# Altium footprint library Capacitors.PcbLib: 90 footprints (part 6 of 6)
Each footprint in its own frame and in the unit in brackets; x right, y up, seen from the top. Pads: shape width x height; smd on the part's side, far side on the other; paste and mask are expansions set on the pad; w line width, h text height; cw(c..) or ccw(c..) is an arc to the next point about the centre after c.
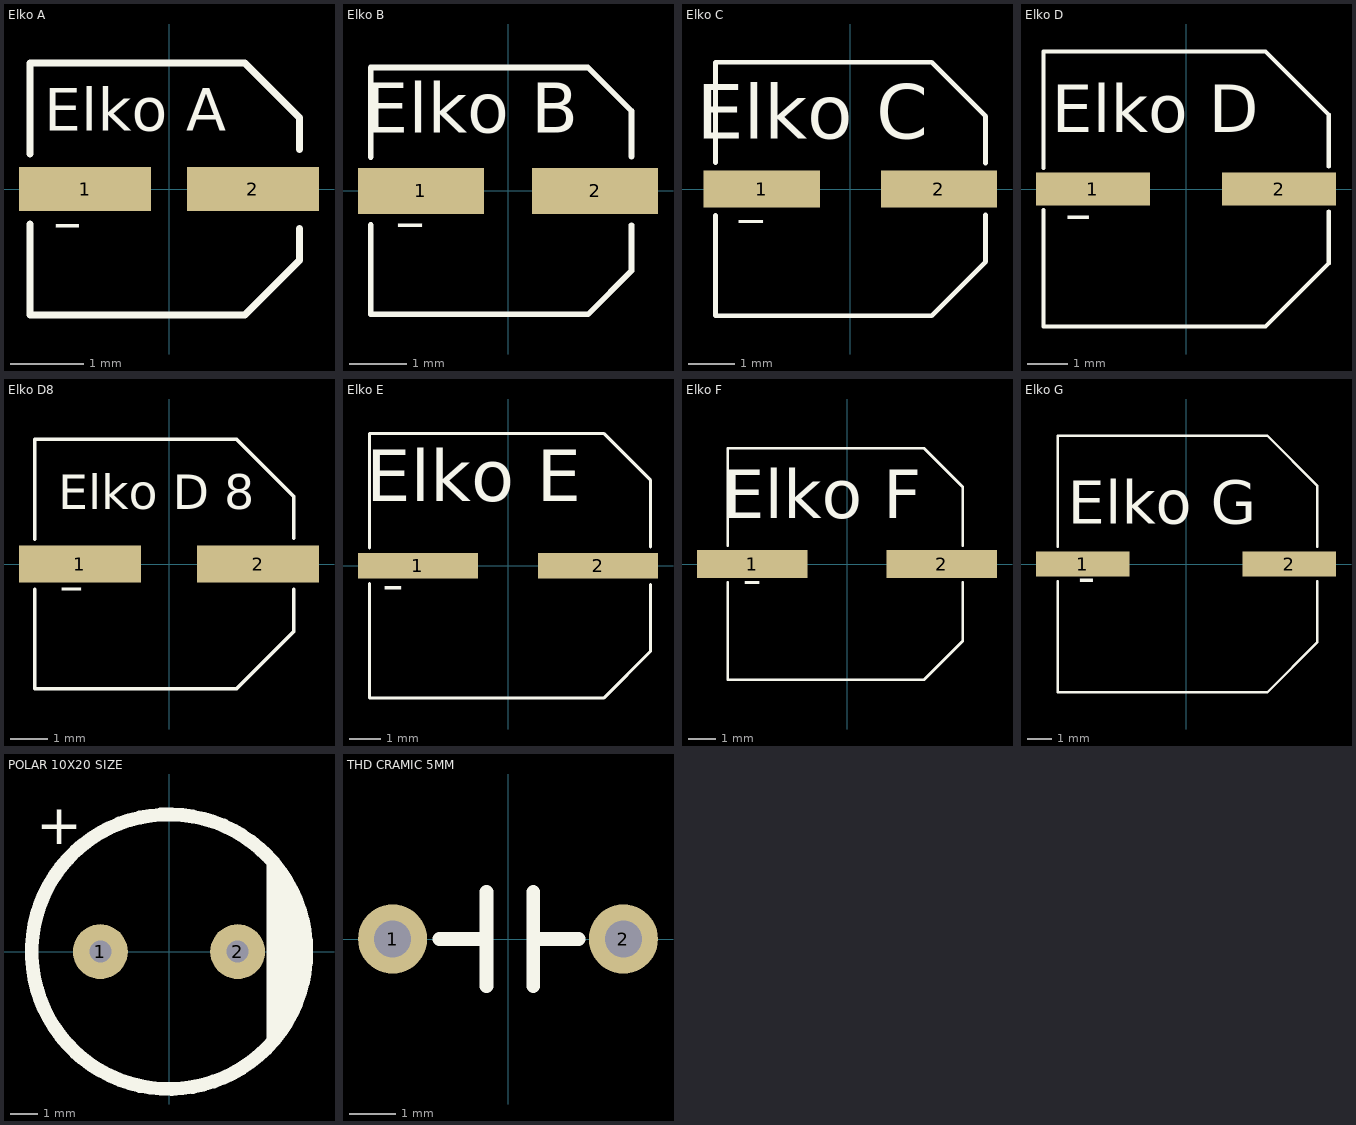
[diagram p5: the footprints below, top view; thin cyan lines are the x and y axes]

## Elko A [mm] "Elko A SIZE"
pads (2):
  rect 1.8x0.6 smd: 1(-1.143,0) 2(1.143,0)
Top Overlay:
  lines w0.1: -1.893,-0.479 -1.893,-1.715 1.031,-1.715 ; -1.893,0.479 -1.893,1.715 1.031,1.715 ; 0.946,-1.716 1.031,-1.716 ; 0.946,1.716 1.031,1.716 ; 1.778,-0.541 1.778,-0.969 1.031,-1.716 ; 1.778,0.541 1.778,0.969 1.031,1.716
  text "Elko A" at -1.7,0.6 h1
  text "-" at -1.6,-1.088 h1.5
3D body "User Library-ALU-A.STEP": height 5.4, standoff 0, extent -1.822,-1.649 1.778,1.651

## Elko B [mm]
pads (2):
  rect 2.2x0.8 smd: 1(-1.524,0) 2(1.524,0)
Top Overlay:
  lines w0.1: -2.401,-0.595 -2.401,-2.159 1.397,-2.159 2.159,-1.397 2.159,-0.601 ; -2.401,0.595 -2.401,2.159 1.397,2.159 2.159,1.397 2.159,0.601
  text "-" at -2,-1.384 h2
  text "Elko B" at -2.5,0.727 h1.5
3D body "User Library-ALU-B.STEP": height 5.4, standoff 0, extent -2.441,-2.141 2.159,2.159

## Elko C [mm]
pads (2):
  rect 2.5x0.8 smd: 1(-1.905,0) 2(1.905,0)
Top Overlay:
  lines w0.1: -2.903,-0.564 -2.903,-2.727 1.751,-2.727 2.909,-1.569 2.909,-0.554 ; -2.903,0.564 -2.903,2.727 1.751,2.727 2.909,1.569 2.909,0.554
  text "Elko C" at -3.3,0.697 h2
  text "-" at -2.5,-1.679 h2.5
3D body "User Library-ALU-C.STEP": height 5.41, standoff 0, extent -2.95,-2.65 2.95,2.65

## Elko D [mm]
pads (2):
  rect 2.8x0.8 smd: 1(-2.286,0) 2(2.286,0)
Top Overlay:
  lines w0.1: -3.505,-0.512 -3.505,-3.378 1.956,-3.378 3.507,-1.827 3.507,-0.557 ; -3.505,0.512 -3.505,3.378 1.956,3.378 3.507,1.827 3.507,0.557
  text "-" at -3,-1.679 h2.5
  text "Elko D" at -3.3,1.018 h2
3D body "User Library-ALU-D.STEP": height 5.4, standoff 0, extent -3.5,-3.3 3.5,3.3

## Elko D8 [mm]
pads (2):
  rect 3.3x1 smd: 1(-2.413,0) 2(2.413,0)
Top Overlay:
  lines w0.1: -3.632,-0.682 -3.632,-3.378 1.829,-3.378 3.38,-1.827 3.38,-0.68 ; -3.632,0.667 -3.632,3.378 1.829,3.378 3.38,1.827 3.38,0.695
  text "Elko D 8" at -3,1.169 h1.6
  text "-" at -3,-1.679 h2.5
3D body "User Library-ALU-D8.STEP": height 7.7, standoff 0, extent -3.5,-3.3 3.5,3.3

## Elko E [mm]
pads (2):
  rect 3.8x0.8 smd: 1(-2.857,0) 2(2.857,0)
Top Overlay:
  lines w0.1: -4.394,-0.563 -4.394,-4.191 3.048,-4.191 4.517,-2.722 4.517,-0.602 ; -4.394,0.563 -4.394,4.191 3.048,4.191 4.517,2.722 4.517,0.602
  text "-" at -4,-1.679 h2.5
  text "Elko E" at -4.5,1.5 h2.8
3D body "User Library-ALU-E.STEP": height 6.2, standoff 0, extent -4.436,-4.15 4.564,4.15

## Elko F [mm]
pads (2):
  rect 4x1 smd: 1(-3.429,0) 2(3.429,0)
Top Overlay:
  lines w0.1: -4.318,-0.668 -4.318,-4.191 2.794,-4.191 ; -4.318,0.668 -4.318,4.191 2.794,4.191 4.191,2.794 4.191,0.674 ; 2.794,-4.191 4.191,-2.794 ; 2.794,-4.191 4.191,-2.794 ; 4.191,-2.794 4.191,-0.674 4.191,-2.794
  text "-" at -3.8,-1.679 h2.5
  text "Elko F" at -4.5,1.076 h3
3D body "User Library-ALU-F.STEP": height 10.2, standoff 0, extent -4.95,-4.15 4.95,4.15

## Elko G [mm]
pads (2):
  rect 3.8x1 smd: 1(-4.191,0) 2(4.191,0)
Top Overlay:
  lines w0.1: -5.207,-0.707 -5.207,-5.207 3.302,-5.207 5.334,-3.175 5.334,-0.696 ; -5.207,0.707 -5.207,5.207 3.302,5.207 5.334,3.175 5.334,0.696
  text "-" at -4.4,-1.679 h2.5
  text "Elko G" at -4.8,1.044 h3
3D body "User Library-ALU-G.STEP": height 10.2, standoff 0, extent -5.8,-5.15 5.8,5.15

## POLAR 10X20 SIZE [mm]
pads (2):
  round 2 hole 0.8: 1(-2.5,0) 2(2.5,0)
Top Overlay:
  circle w0.5: c0,0 r5
  rectangle: 3.556,-3.302 4.064,-2.667
  rectangle: 3.556,2.54 4.064,3.175
  rectangle: 3.556,-2.794 4.445,2.794
  rectangle: 3.81,-1.905 4.826,1.905
  text "+" at -4.826,3.424 h2.5
3D body "User Library-Cap electro 10x20x5_0mm.step": height 20.28, standoff -3.99, extent -5.016,-5.027 5.025,5.023

## THD CRAMIC 5MM [mm]
pads (2):
  round 1.5 hole 0.8: 1(-2.5,0) 2(2.5,0)
Top Overlay:
  lines w0.3: -1.484,0 -0.468,0 -0.468,-1.016 -0.468,1.016 ; 0.548,-1.016 0.548,1.016 ; 0.548,0 1.524,0
3D body "DIP ceramic CAP.STEP": height 7.54, standoff -1.5, extent -2.75,-1.25 2.75,1.25